# Altium schematic symbol library jlcpcb_2025_04_capacitors_extended_0603.schlib: 3668 symbols (part 20 of 20)
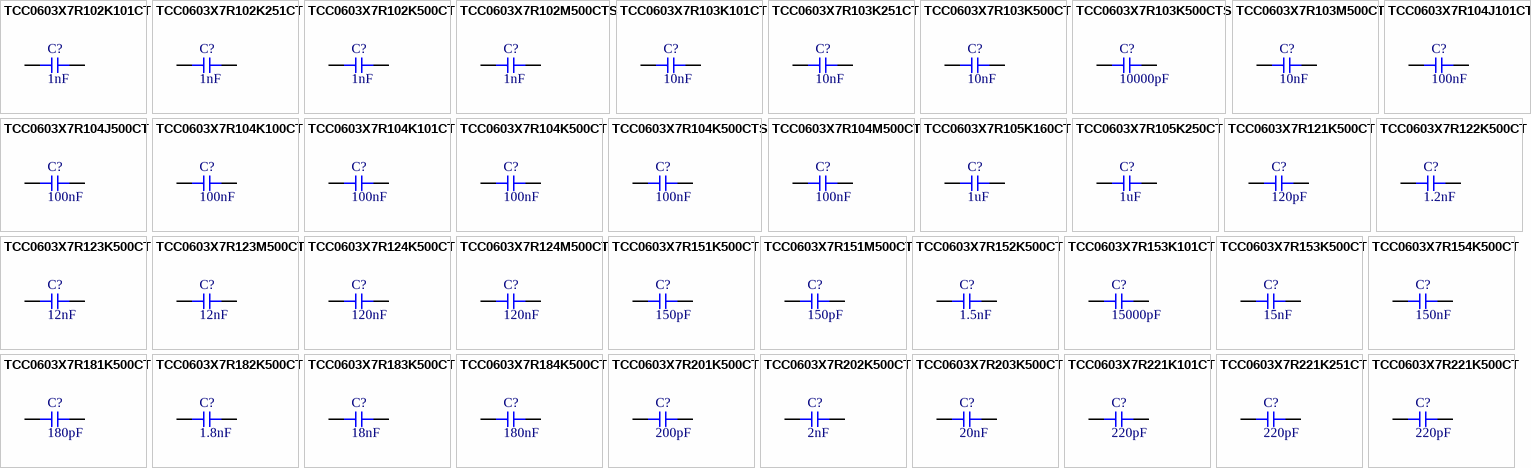
[diagram p110: symbols TCC0603X7R102K101CT to TCC0603X7R221K500CT]

## TCC0603X7R202K500CT
designator C?  Capacitance: 2nF  (hidden comment: *)
Capacitor, Ceramic (MLCC), 2nF, ±10%, 50V, X7R, ±10%, SMD 0603; Manufacturer: CCTC; Manufacturer Part Number: TCC0603X7R202K500CT; Package Size: 0603; JLCPCB Basic Part: No; JLCPCB Part Number: C376818; Supplier 1: LCSC; Category: Capacitors - MLCC; Supplier Part Number 1: C376818; Tolerance: ±10%; Voltage Rating: 50V; Temperature Coefficient: X7R; RoHS: Yes; ComponentLink1Description: Datasheet; ComponentLink1URL: https://wmsc.lcsc.com/wmsc/upload/file/pdf/v2/lcsc/2304140030_CCTC-TCC0603X7R202K500CT_C376818.pdf; ComponentLink2Description: JLCPCB Part URL; ComponentLink2URL: https://jlcpcb.com/partdetail/C376818; ComponentLink3Description: LCSC Part URL; ComponentLink3URL: https://lcsc.com/product-detail/Multilayer-Ceramic-Capacitors-MLCC---SMD-SMT_CCTC-CCTC-TCC0603X7R202K500CT_C376818.html
footprint CAP-0603 (0603 (1608M) Capacitor)
pins: 1, 2

## TCC0603X7R203K500CT
designator C?  Capacitance: 20nF  (hidden comment: *)
Capacitor, Ceramic (MLCC), 20nF, ±10%, 50V, X7R, ±10%, SMD 0603; Manufacturer: CCTC; Manufacturer Part Number: TCC0603X7R203K500CT; Package Size: 0603; JLCPCB Basic Part: No; JLCPCB Part Number: C376819; Supplier 1: LCSC; Category: Capacitors - MLCC; Supplier Part Number 1: C376819; Tolerance: ±10%; Voltage Rating: 50V; Temperature Coefficient: X7R; RoHS: Yes; ComponentLink1Description: Datasheet; ComponentLink1URL: https://wmsc.lcsc.com/wmsc/upload/file/pdf/v2/lcsc/2304140030_CCTC-TCC0603X7R203K500CT_C376819.pdf; ComponentLink2Description: JLCPCB Part URL; ComponentLink2URL: https://jlcpcb.com/partdetail/C376819; ComponentLink3Description: LCSC Part URL; ComponentLink3URL: https://lcsc.com/product-detail/Multilayer-Ceramic-Capacitors-MLCC---SMD-SMT_CCTC-CCTC-TCC0603X7R203K500CT_C376819.html
footprint CAP-0603 (0603 (1608M) Capacitor)
pins: 1, 2

## TCC0603X7R221K101CT
designator C?  Capacitance: 220pF  (hidden comment: *)
Capacitor, Ceramic (MLCC), 220pF, ±10%, 100V, X7R, ±10%, SMD 0603; Manufacturer: CCTC; Manufacturer Part Number: TCC0603X7R221K101CT; Package Size: 0603; JLCPCB Basic Part: No; JLCPCB Part Number: C376820; Supplier 1: LCSC; Category: Capacitors - MLCC; Supplier Part Number 1: C376820; Tolerance: ±10%; Voltage Rating: 100V; Temperature Coefficient: X7R; RoHS: Yes; ComponentLink1Description: Datasheet; ComponentLink1URL: https://wmsc.lcsc.com/wmsc/upload/file/pdf/v2/lcsc/2304140030_CCTC-TCC0603X7R221K101CT_C376820.pdf; ComponentLink2Description: JLCPCB Part URL; ComponentLink2URL: https://jlcpcb.com/partdetail/C376820; ComponentLink3Description: LCSC Part URL; ComponentLink3URL: https://lcsc.com/product-detail/Multilayer-Ceramic-Capacitors-MLCC---SMD-SMT_CCTC-CCTC-TCC0603X7R221K101CT_C376820.html
footprint CAP-0603 (0603 (1608M) Capacitor)
pins: 1, 2

## TCC0603X7R221K251CT
designator C?  Capacitance: 220pF  (hidden comment: *)
Capacitor, Ceramic (MLCC), 220pF, ±10%, 250V, X7R, ±10%, SMD 0603; Manufacturer: CCTC; Manufacturer Part Number: TCC0603X7R221K251CT; Package Size: 0603; JLCPCB Basic Part: No; JLCPCB Part Number: C696874; Supplier 1: LCSC; Category: Capacitors - MLCC; Supplier Part Number 1: C696874; Tolerance: ±10%; Voltage Rating: 250V; Temperature Coefficient: X7R; RoHS: Yes; ComponentLink1Description: Datasheet; ComponentLink1URL: https://wmsc.lcsc.com/wmsc/upload/file/pdf/v2/lcsc/2304140030_CCTC-TCC0603X7R221K251CT_C696874.pdf; ComponentLink2Description: JLCPCB Part URL; ComponentLink2URL: https://jlcpcb.com/partdetail/C696874; ComponentLink3Description: LCSC Part URL; ComponentLink3URL: https://lcsc.com/product-detail/Multilayer-Ceramic-Capacitors-MLCC---SMD-SMT_CCTC-CCTC-TCC0603X7R221K251CT_C696874.html
footprint CAP-0603 (0603 (1608M) Capacitor)
pins: 1, 2

## TCC0603X7R221K500CT
designator C?  Capacitance: 220pF  (hidden comment: *)
Capacitor, Ceramic (MLCC), 220pF, ±10%, 50V, X7R, ±10%, SMD 0603; Manufacturer: CCTC; Manufacturer Part Number: TCC0603X7R221K500CT; Package Size: 0603; JLCPCB Basic Part: No; JLCPCB Part Number: C282676; Supplier 1: LCSC; Category: Capacitors - MLCC; Supplier Part Number 1: C282676; Tolerance: ±10%; Voltage Rating: 50V; Temperature Coefficient: X7R; RoHS: Yes; ComponentLink1Description: Datasheet; ComponentLink1URL: https://wmsc.lcsc.com/wmsc/upload/file/pdf/v2/lcsc/2304140030_CCTC-TCC0603X7R221K500CT_C282676.pdf; ComponentLink2Description: JLCPCB Part URL; ComponentLink2URL: https://jlcpcb.com/partdetail/C282676; ComponentLink3Description: LCSC Part URL; ComponentLink3URL: https://lcsc.com/product-detail/Multilayer-Ceramic-Capacitors-MLCC---SMD-SMT_CCTC-CCTC-TCC0603X7R221K500CT_C282676.html
footprint CAP-0603 (0603 (1608M) Capacitor)
pins: 1, 2

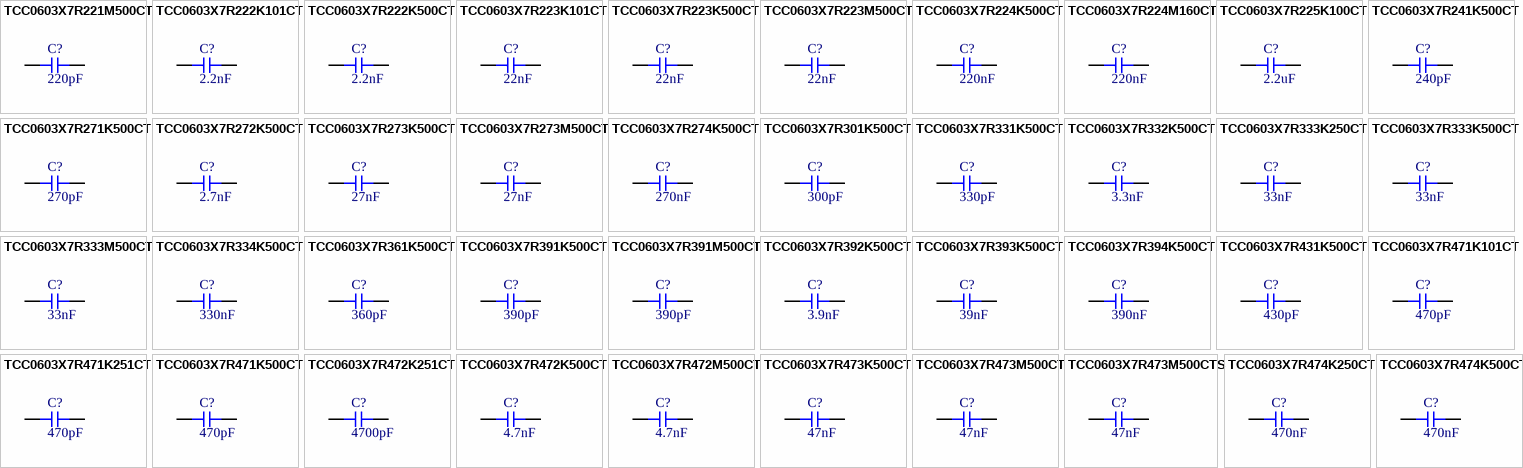
[diagram p88: symbols TCC0603X7R221M500CT to TCC0603X7R474K500CT]

## TCC0603X7R221M500CT
designator C?  Capacitance: 220pF  (hidden comment: *)
Capacitor, Ceramic (MLCC), 220pF, ±20%, 50V, X7R, ±20%, SMD 0603; Manufacturer: CCTC; Manufacturer Part Number: TCC0603X7R221M500CT; Package Size: 0603; JLCPCB Basic Part: No; JLCPCB Part Number: C2760542; Supplier 1: LCSC; Category: Capacitors - MLCC; Supplier Part Number 1: C2760542; Tolerance: ±20%; Voltage Rating: 50V; Temperature Coefficient: X7R; RoHS: Yes; ComponentLink1Description: Datasheet; ComponentLink1URL: https://wmsc.lcsc.com/wmsc/upload/file/pdf/v2/lcsc/2304140030_CCTC-TCC0603X7R221M500CT_C2760542.pdf; ComponentLink2Description: JLCPCB Part URL; ComponentLink2URL: https://jlcpcb.com/partdetail/C2760542; ComponentLink3Description: LCSC Part URL; ComponentLink3URL: https://lcsc.com/product-detail/Multilayer-Ceramic-Capacitors-MLCC---SMD-SMT_CCTC-CCTC-TCC0603X7R221M500CT_C2760542.html
footprint CAP-0603 (0603 (1608M) Capacitor)
pins: 1, 2

## TCC0603X7R222K101CT
designator C?  Capacitance: 2.2nF  (hidden comment: *)
Capacitor, Ceramic (MLCC), 2.2nF, ±10%, 100V, X7R, ±10%, SMD 0603; Manufacturer: CCTC; Manufacturer Part Number: TCC0603X7R222K101CT; Package Size: 0603; JLCPCB Basic Part: No; JLCPCB Part Number: C344172; Supplier 1: LCSC; Category: Capacitors - MLCC; Supplier Part Number 1: C344172; Tolerance: ±10%; Voltage Rating: 100V; Temperature Coefficient: X7R; RoHS: Yes; ComponentLink1Description: Datasheet; ComponentLink1URL: https://wmsc.lcsc.com/wmsc/upload/file/pdf/v2/lcsc/2304140030_CCTC-TCC0603X7R222K101CT_C344172.pdf; ComponentLink2Description: JLCPCB Part URL; ComponentLink2URL: https://jlcpcb.com/partdetail/C344172; ComponentLink3Description: LCSC Part URL; ComponentLink3URL: https://lcsc.com/product-detail/Multilayer-Ceramic-Capacitors-MLCC---SMD-SMT_CCTC-CCTC-TCC0603X7R222K101CT_C344172.html
footprint CAP-0603 (0603 (1608M) Capacitor)
pins: 1, 2

## TCC0603X7R222K500CT
designator C?  Capacitance: 2.2nF  (hidden comment: *)
Capacitor, Ceramic (MLCC), 2.2nF, ±10%, 50V, X7R, ±10%, SMD 0603; Manufacturer: CCTC; Manufacturer Part Number: TCC0603X7R222K500CT; Package Size: 0603; JLCPCB Basic Part: No; JLCPCB Part Number: C374074; Supplier 1: LCSC; Category: Capacitors - MLCC; Supplier Part Number 1: C374074; Tolerance: ±10%; Voltage Rating: 50V; Temperature Coefficient: X7R; RoHS: Yes; ComponentLink1Description: Datasheet; ComponentLink1URL: https://wmsc.lcsc.com/wmsc/upload/file/pdf/v2/lcsc/2304140030_CCTC-TCC0603X7R222K500CT_C374074.pdf; ComponentLink2Description: JLCPCB Part URL; ComponentLink2URL: https://jlcpcb.com/partdetail/C374074; ComponentLink3Description: LCSC Part URL; ComponentLink3URL: https://lcsc.com/product-detail/Multilayer-Ceramic-Capacitors-MLCC---SMD-SMT_CCTC-CCTC-TCC0603X7R222K500CT_C374074.html
footprint CAP-0603 (0603 (1608M) Capacitor)
pins: 1, 2

## TCC0603X7R223K101CT
designator C?  Capacitance: 22nF  (hidden comment: *)
Capacitor, Ceramic (MLCC), 22nF, ±10%, 100V, X7R, ±10%, SMD 0603; Manufacturer: CCTC; Manufacturer Part Number: TCC0603X7R223K101CT; Package Size: 0603; JLCPCB Basic Part: No; JLCPCB Part Number: C376821; Supplier 1: LCSC; Category: Capacitors - MLCC; Supplier Part Number 1: C376821; Tolerance: ±10%; Voltage Rating: 100V; Temperature Coefficient: X7R; RoHS: Yes; ComponentLink1Description: Datasheet; ComponentLink1URL: https://wmsc.lcsc.com/wmsc/upload/file/pdf/v2/lcsc/2304140030_CCTC-TCC0603X7R223K101CT_C376821.pdf; ComponentLink2Description: JLCPCB Part URL; ComponentLink2URL: https://jlcpcb.com/partdetail/C376821; ComponentLink3Description: LCSC Part URL; ComponentLink3URL: https://lcsc.com/product-detail/Multilayer-Ceramic-Capacitors-MLCC---SMD-SMT_CCTC-CCTC-TCC0603X7R223K101CT_C376821.html
footprint CAP-0603 (0603 (1608M) Capacitor)
pins: 1, 2

## TCC0603X7R223K500CT
designator C?  Capacitance: 22nF  (hidden comment: *)
Capacitor, Ceramic (MLCC), 22nF, ±10%, 50V, X7R, ±10%, SMD 0603; Manufacturer: CCTC; Manufacturer Part Number: TCC0603X7R223K500CT; Package Size: 0603; JLCPCB Basic Part: No; JLCPCB Part Number: C282677; Supplier 1: LCSC; Category: Capacitors - MLCC; Supplier Part Number 1: C282677; Tolerance: ±10%; Voltage Rating: 50V; Temperature Coefficient: X7R; RoHS: Yes; ComponentLink1Description: Datasheet; ComponentLink1URL: https://wmsc.lcsc.com/wmsc/upload/file/pdf/v2/lcsc/2304140030_CCTC-TCC0603X7R223K500CT_C282677.pdf; ComponentLink2Description: JLCPCB Part URL; ComponentLink2URL: https://jlcpcb.com/partdetail/C282677; ComponentLink3Description: LCSC Part URL; ComponentLink3URL: https://lcsc.com/product-detail/Multilayer-Ceramic-Capacitors-MLCC---SMD-SMT_CCTC-CCTC-TCC0603X7R223K500CT_C282677.html
footprint CAP-0603 (0603 (1608M) Capacitor)
pins: 1, 2

## TCC0603X7R223M500CT
designator C?  Capacitance: 22nF  (hidden comment: *)
Capacitor, Ceramic (MLCC), 22nF, ±20%, 50V, X7R, ±20%, SMD 0603; Manufacturer: CCTC; Manufacturer Part Number: TCC0603X7R223M500CT; Package Size: 0603; JLCPCB Basic Part: No; JLCPCB Part Number: C696861; Supplier 1: LCSC; Category: Capacitors - MLCC; Supplier Part Number 1: C696861; Tolerance: ±20%; Voltage Rating: 50V; Temperature Coefficient: X7R; RoHS: Yes; ComponentLink1Description: Datasheet; ComponentLink1URL: https://wmsc.lcsc.com/wmsc/upload/file/pdf/v2/lcsc/2304140030_CCTC-TCC0603X7R223M500CT_C696861.pdf; ComponentLink2Description: JLCPCB Part URL; ComponentLink2URL: https://jlcpcb.com/partdetail/C696861; ComponentLink3Description: LCSC Part URL; ComponentLink3URL: https://lcsc.com/product-detail/Multilayer-Ceramic-Capacitors-MLCC---SMD-SMT_CCTC-CCTC-TCC0603X7R223M500CT_C696861.html
footprint CAP-0603 (0603 (1608M) Capacitor)
pins: 1, 2

## TCC0603X7R224K500CT
designator C?  Capacitance: 220nF  (hidden comment: *)
Capacitor, Ceramic (MLCC), 220nF, ±10%, 50V, X7R, ±10%, SMD 0603; Manufacturer: CCTC; Manufacturer Part Number: TCC0603X7R224K500CT; Package Size: 0603; JLCPCB Basic Part: No; JLCPCB Part Number: C344195; Supplier 1: LCSC; Category: Capacitors - MLCC; Supplier Part Number 1: C344195; Tolerance: ±10%; Voltage Rating: 50V; Temperature Coefficient: X7R; RoHS: Yes; ComponentLink1Description: Datasheet; ComponentLink1URL: https://wmsc.lcsc.com/wmsc/upload/file/pdf/v2/lcsc/2304140030_CCTC-TCC0603X7R224K500CT_C344195.pdf; ComponentLink2Description: JLCPCB Part URL; ComponentLink2URL: https://jlcpcb.com/partdetail/C344195; ComponentLink3Description: LCSC Part URL; ComponentLink3URL: https://lcsc.com/product-detail/Multilayer-Ceramic-Capacitors-MLCC---SMD-SMT_CCTC-CCTC-TCC0603X7R224K500CT_C344195.html
footprint CAP-0603 (0603 (1608M) Capacitor)
pins: 1, 2

## TCC0603X7R224M160CT
designator C?  Capacitance: 220nF  (hidden comment: *)
Capacitor, Ceramic (MLCC), 220nF, ±20%, 16V, X7R, ±20%, SMD 0603; Manufacturer: CCTC; Manufacturer Part Number: TCC0603X7R224M160CT; Package Size: 0603; JLCPCB Basic Part: No; JLCPCB Part Number: C376822; Supplier 1: LCSC; Category: Capacitors - MLCC; Supplier Part Number 1: C376822; Tolerance: ±20%; Voltage Rating: 16V; Temperature Coefficient: X7R; RoHS: Yes; ComponentLink1Description: Datasheet; ComponentLink1URL: https://wmsc.lcsc.com/wmsc/upload/file/pdf/v2/lcsc/2304140030_CCTC-TCC0603X7R224M160CT_C376822.pdf; ComponentLink2Description: JLCPCB Part URL; ComponentLink2URL: https://jlcpcb.com/partdetail/C376822; ComponentLink3Description: LCSC Part URL; ComponentLink3URL: https://lcsc.com/product-detail/Multilayer-Ceramic-Capacitors-MLCC---SMD-SMT_CCTC-CCTC-TCC0603X7R224M160CT_C376822.html
footprint CAP-0603 (0603 (1608M) Capacitor)
pins: 1, 2

## TCC0603X7R225K100CT
designator C?  Capacitance: 2.2uF  (hidden comment: *)
Capacitor, Ceramic (MLCC), 2.2uF, ±10%, 10V, X7R, ±10%, SMD 0603; Manufacturer: CCTC; Manufacturer Part Number: TCC0603X7R225K100CT; Package Size: 0603; JLCPCB Basic Part: No; JLCPCB Part Number: C380329; Supplier 1: LCSC; Category: Capacitors - MLCC; Supplier Part Number 1: C380329; Tolerance: ±10%; Voltage Rating: 10V; Temperature Coefficient: X7R; RoHS: Yes; ComponentLink1Description: Datasheet; ComponentLink1URL: https://wmsc.lcsc.com/wmsc/upload/file/pdf/v2/lcsc/2304140030_CCTC-TCC0603X7R225K100CT_C380329.pdf; ComponentLink2Description: JLCPCB Part URL; ComponentLink2URL: https://jlcpcb.com/partdetail/C380329; ComponentLink3Description: LCSC Part URL; ComponentLink3URL: https://lcsc.com/product-detail/Multilayer-Ceramic-Capacitors-MLCC---SMD-SMT_CCTC-CCTC-TCC0603X7R225K100CT_C380329.html
footprint CAP-0603 (0603 (1608M) Capacitor)
pins: 1, 2

## TCC0603X7R241K500CT
designator C?  Capacitance: 240pF  (hidden comment: *)
Capacitor, Ceramic (MLCC), 240pF, ±10%, 50V, X7R, ±10%, SMD 0603; Manufacturer: CCTC; Manufacturer Part Number: TCC0603X7R241K500CT; Package Size: 0603; JLCPCB Basic Part: No; JLCPCB Part Number: C376823; Supplier 1: LCSC; Category: Capacitors - MLCC; Supplier Part Number 1: C376823; Tolerance: ±10%; Voltage Rating: 50V; Temperature Coefficient: X7R; RoHS: Yes; ComponentLink1Description: Datasheet; ComponentLink1URL: https://wmsc.lcsc.com/wmsc/upload/file/pdf/v2/lcsc/2304140030_CCTC-TCC0603X7R241K500CT_C376823.pdf; ComponentLink2Description: JLCPCB Part URL; ComponentLink2URL: https://jlcpcb.com/partdetail/C376823; ComponentLink3Description: LCSC Part URL; ComponentLink3URL: https://lcsc.com/product-detail/Multilayer-Ceramic-Capacitors-MLCC---SMD-SMT_CCTC-CCTC-TCC0603X7R241K500CT_C376823.html
footprint CAP-0603 (0603 (1608M) Capacitor)
pins: 1, 2

## TCC0603X7R271K500CT
designator C?  Capacitance: 270pF  (hidden comment: *)
Capacitor, Ceramic (MLCC), 270pF, ±10%, 50V, X7R, ±10%, SMD 0603; Manufacturer: CCTC; Manufacturer Part Number: TCC0603X7R271K500CT; Package Size: 0603; JLCPCB Basic Part: No; JLCPCB Part Number: C376824; Supplier 1: LCSC; Category: Capacitors - MLCC; Supplier Part Number 1: C376824; Tolerance: ±10%; Voltage Rating: 50V; Temperature Coefficient: X7R; RoHS: Yes; ComponentLink1Description: Datasheet; ComponentLink1URL: https://wmsc.lcsc.com/wmsc/upload/file/pdf/v2/lcsc/2304140030_CCTC-TCC0603X7R271K500CT_C376824.pdf; ComponentLink2Description: JLCPCB Part URL; ComponentLink2URL: https://jlcpcb.com/partdetail/C376824; ComponentLink3Description: LCSC Part URL; ComponentLink3URL: https://lcsc.com/product-detail/Multilayer-Ceramic-Capacitors-MLCC---SMD-SMT_CCTC-CCTC-TCC0603X7R271K500CT_C376824.html
footprint CAP-0603 (0603 (1608M) Capacitor)
pins: 1, 2

## TCC0603X7R272K500CT
designator C?  Capacitance: 2.7nF  (hidden comment: *)
Capacitor, Ceramic (MLCC), 2.7nF, ±10%, 50V, X7R, ±10%, SMD 0603; Manufacturer: CCTC; Manufacturer Part Number: TCC0603X7R272K500CT; Package Size: 0603; JLCPCB Basic Part: No; JLCPCB Part Number: C376825; Supplier 1: LCSC; Category: Capacitors - MLCC; Supplier Part Number 1: C376825; Tolerance: ±10%; Voltage Rating: 50V; Temperature Coefficient: X7R; RoHS: Yes; ComponentLink1Description: Datasheet; ComponentLink1URL: https://wmsc.lcsc.com/wmsc/upload/file/pdf/v2/lcsc/2304140030_CCTC-TCC0603X7R272K500CT_C376825.pdf; ComponentLink2Description: JLCPCB Part URL; ComponentLink2URL: https://jlcpcb.com/partdetail/C376825; ComponentLink3Description: LCSC Part URL; ComponentLink3URL: https://lcsc.com/product-detail/Multilayer-Ceramic-Capacitors-MLCC---SMD-SMT_CCTC-CCTC-TCC0603X7R272K500CT_C376825.html
footprint CAP-0603 (0603 (1608M) Capacitor)
pins: 1, 2

## TCC0603X7R273K500CT
designator C?  Capacitance: 27nF  (hidden comment: *)
Capacitor, Ceramic (MLCC), 27nF, ±10%, 50V, X7R, ±10%, SMD 0603; Manufacturer: CCTC; Manufacturer Part Number: TCC0603X7R273K500CT; Package Size: 0603; JLCPCB Basic Part: No; JLCPCB Part Number: C282678; Supplier 1: LCSC; Category: Capacitors - MLCC; Supplier Part Number 1: C282678; Tolerance: ±10%; Voltage Rating: 50V; Temperature Coefficient: X7R; RoHS: Yes; ComponentLink1Description: Datasheet; ComponentLink1URL: https://wmsc.lcsc.com/wmsc/upload/file/pdf/v2/lcsc/2304140030_CCTC-TCC0603X7R273K500CT_C282678.pdf; ComponentLink2Description: JLCPCB Part URL; ComponentLink2URL: https://jlcpcb.com/partdetail/C282678; ComponentLink3Description: LCSC Part URL; ComponentLink3URL: https://lcsc.com/product-detail/Multilayer-Ceramic-Capacitors-MLCC---SMD-SMT_CCTC-CCTC-TCC0603X7R273K500CT_C282678.html
footprint CAP-0603 (0603 (1608M) Capacitor)
pins: 1, 2

## TCC0603X7R273M500CT
designator C?  Capacitance: 27nF  (hidden comment: *)
Capacitor, Ceramic (MLCC), 27nF, ±10%, 50V, X7R, ±10%, SMD 0603; Manufacturer: CCTC; Manufacturer Part Number: TCC0603X7R273M500CT; Package Size: 0603; JLCPCB Basic Part: No; JLCPCB Part Number: C778607; Supplier 1: LCSC; Category: Capacitors - MLCC; Supplier Part Number 1: C778607; Tolerance: ±10%; Voltage Rating: 50V; Temperature Coefficient: X7R; RoHS: Yes; ComponentLink1Description: Datasheet; ComponentLink1URL: https://wmsc.lcsc.com/wmsc/upload/file/pdf/v2/lcsc/2304140030_CCTC-TCC0603X7R273M500CT_C778607.pdf; ComponentLink2Description: JLCPCB Part URL; ComponentLink2URL: https://jlcpcb.com/partdetail/C778607; ComponentLink3Description: LCSC Part URL; ComponentLink3URL: https://lcsc.com/product-detail/Multilayer-Ceramic-Capacitors-MLCC---SMD-SMT_CCTC-CCTC-TCC0603X7R273M500CT_C778607.html
footprint CAP-0603 (0603 (1608M) Capacitor)
pins: 1, 2

## TCC0603X7R274K500CT
designator C?  Capacitance: 270nF  (hidden comment: *)
Capacitor, Ceramic (MLCC), 270nF, ±10%, 50V, X7R, ±10%, SMD 0603; Manufacturer: CCTC; Manufacturer Part Number: TCC0603X7R274K500CT; Package Size: 0603; JLCPCB Basic Part: No; JLCPCB Part Number: C376826; Supplier 1: LCSC; Category: Capacitors - MLCC; Supplier Part Number 1: C376826; Tolerance: ±10%; Voltage Rating: 50V; Temperature Coefficient: X7R; RoHS: Yes; ComponentLink1Description: Datasheet; ComponentLink1URL: https://wmsc.lcsc.com/wmsc/upload/file/pdf/v2/lcsc/2304140030_CCTC-TCC0603X7R274K500CT_C376826.pdf; ComponentLink2Description: JLCPCB Part URL; ComponentLink2URL: https://jlcpcb.com/partdetail/C376826; ComponentLink3Description: LCSC Part URL; ComponentLink3URL: https://lcsc.com/product-detail/Multilayer-Ceramic-Capacitors-MLCC---SMD-SMT_CCTC-CCTC-TCC0603X7R274K500CT_C376826.html
footprint CAP-0603 (0603 (1608M) Capacitor)
pins: 1, 2

## TCC0603X7R301K500CT
designator C?  Capacitance: 300pF  (hidden comment: *)
Capacitor, Ceramic (MLCC), 300pF, ±10%, 50V, X7R, ±10%, SMD 0603; Manufacturer: CCTC; Manufacturer Part Number: TCC0603X7R301K500CT; Package Size: 0603; JLCPCB Basic Part: No; JLCPCB Part Number: C376827; Supplier 1: LCSC; Category: Capacitors - MLCC; Supplier Part Number 1: C376827; Tolerance: ±10%; Voltage Rating: 50V; Temperature Coefficient: X7R; RoHS: Yes; ComponentLink1Description: Datasheet; ComponentLink1URL: https://wmsc.lcsc.com/wmsc/upload/file/pdf/v2/lcsc/2304140030_CCTC-TCC0603X7R301K500CT_C376827.pdf; ComponentLink2Description: JLCPCB Part URL; ComponentLink2URL: https://jlcpcb.com/partdetail/C376827; ComponentLink3Description: LCSC Part URL; ComponentLink3URL: https://lcsc.com/product-detail/Multilayer-Ceramic-Capacitors-MLCC---SMD-SMT_CCTC-CCTC-TCC0603X7R301K500CT_C376827.html
footprint CAP-0603 (0603 (1608M) Capacitor)
pins: 1, 2

## TCC0603X7R331K500CT
designator C?  Capacitance: 330pF  (hidden comment: *)
Capacitor, Ceramic (MLCC), 330pF, ±10%, 50V, X7R, ±10%, SMD 0603; Manufacturer: CCTC; Manufacturer Part Number: TCC0603X7R331K500CT; Package Size: 0603; JLCPCB Basic Part: No; JLCPCB Part Number: C282679; Supplier 1: LCSC; Category: Capacitors - MLCC; Supplier Part Number 1: C282679; Tolerance: ±10%; Voltage Rating: 50V; Temperature Coefficient: X7R; RoHS: Yes; ComponentLink1Description: Datasheet; ComponentLink1URL: https://wmsc.lcsc.com/wmsc/upload/file/pdf/v2/lcsc/2304140030_CCTC-TCC0603X7R331K500CT_C282679.pdf; ComponentLink2Description: JLCPCB Part URL; ComponentLink2URL: https://jlcpcb.com/partdetail/C282679; ComponentLink3Description: LCSC Part URL; ComponentLink3URL: https://lcsc.com/product-detail/Multilayer-Ceramic-Capacitors-MLCC---SMD-SMT_CCTC-CCTC-TCC0603X7R331K500CT_C282679.html
footprint CAP-0603 (0603 (1608M) Capacitor)
pins: 1, 2

## TCC0603X7R332K500CT
designator C?  Capacitance: 3.3nF  (hidden comment: *)
Capacitor, Ceramic (MLCC), 3.3nF, ±10%, 50V, X7R, ±10%, SMD 0603; Manufacturer: CCTC; Manufacturer Part Number: TCC0603X7R332K500CT; Package Size: 0603; JLCPCB Basic Part: No; JLCPCB Part Number: C282680; Supplier 1: LCSC; Category: Capacitors - MLCC; Supplier Part Number 1: C282680; Tolerance: ±10%; Voltage Rating: 50V; Temperature Coefficient: X7R; RoHS: Yes; ComponentLink1Description: Datasheet; ComponentLink1URL: https://wmsc.lcsc.com/wmsc/upload/file/pdf/v2/lcsc/2304140030_CCTC-TCC0603X7R332K500CT_C282680.pdf; ComponentLink2Description: JLCPCB Part URL; ComponentLink2URL: https://jlcpcb.com/partdetail/C282680; ComponentLink3Description: LCSC Part URL; ComponentLink3URL: https://lcsc.com/product-detail/Multilayer-Ceramic-Capacitors-MLCC---SMD-SMT_CCTC-CCTC-TCC0603X7R332K500CT_C282680.html
footprint CAP-0603 (0603 (1608M) Capacitor)
pins: 1, 2

## TCC0603X7R333K250CT
designator C?  Capacitance: 33nF  (hidden comment: *)
Capacitor, Ceramic (MLCC), 33nF, ±10%, 25V, X7R, ±10%, SMD 0603; Manufacturer: CCTC; Manufacturer Part Number: TCC0603X7R333K250CT; Package Size: 0603; JLCPCB Basic Part: No; JLCPCB Part Number: C376828; Supplier 1: LCSC; Category: Capacitors - MLCC; Supplier Part Number 1: C376828; Tolerance: ±10%; Voltage Rating: 25V; Temperature Coefficient: X7R; RoHS: Yes; ComponentLink1Description: Datasheet; ComponentLink1URL: https://wmsc.lcsc.com/wmsc/upload/file/pdf/v2/lcsc/2304140030_CCTC-TCC0603X7R333K250CT_C376828.pdf; ComponentLink2Description: JLCPCB Part URL; ComponentLink2URL: https://jlcpcb.com/partdetail/C376828; ComponentLink3Description: LCSC Part URL; ComponentLink3URL: https://lcsc.com/product-detail/Multilayer-Ceramic-Capacitors-MLCC---SMD-SMT_CCTC-CCTC-TCC0603X7R333K250CT_C376828.html
footprint CAP-0603 (0603 (1608M) Capacitor)
pins: 1, 2

## TCC0603X7R333K500CT
designator C?  Capacitance: 33nF  (hidden comment: *)
Capacitor, Ceramic (MLCC), 33nF, ±10%, 50V, X7R, ±10%, SMD 0603; Manufacturer: CCTC; Manufacturer Part Number: TCC0603X7R333K500CT; Package Size: 0603; JLCPCB Basic Part: No; JLCPCB Part Number: C282681; Supplier 1: LCSC; Category: Capacitors - MLCC; Supplier Part Number 1: C282681; Tolerance: ±10%; Voltage Rating: 50V; Temperature Coefficient: X7R; RoHS: Yes; ComponentLink1Description: Datasheet; ComponentLink1URL: https://wmsc.lcsc.com/wmsc/upload/file/pdf/v2/lcsc/2304140030_CCTC-TCC0603X7R333K500CT_C282681.pdf; ComponentLink2Description: JLCPCB Part URL; ComponentLink2URL: https://jlcpcb.com/partdetail/C282681; ComponentLink3Description: LCSC Part URL; ComponentLink3URL: https://lcsc.com/product-detail/Multilayer-Ceramic-Capacitors-MLCC---SMD-SMT_CCTC-CCTC-TCC0603X7R333K500CT_C282681.html
footprint CAP-0603 (0603 (1608M) Capacitor)
pins: 1, 2

## TCC0603X7R333M500CT
designator C?  Capacitance: 33nF  (hidden comment: *)
Capacitor, Ceramic (MLCC), 33nF, ±20%, 50V, X7R, ±20%, SMD 0603; Manufacturer: CCTC; Manufacturer Part Number: TCC0603X7R333M500CT; Package Size: 0603; JLCPCB Basic Part: No; JLCPCB Part Number: C696862; Supplier 1: LCSC; Category: Capacitors - MLCC; Supplier Part Number 1: C696862; Tolerance: ±20%; Voltage Rating: 50V; Temperature Coefficient: X7R; RoHS: Yes; ComponentLink1Description: Datasheet; ComponentLink1URL: https://wmsc.lcsc.com/wmsc/upload/file/pdf/v2/lcsc/2304140030_CCTC-TCC0603X7R333M500CT_C696862.pdf; ComponentLink2Description: JLCPCB Part URL; ComponentLink2URL: https://jlcpcb.com/partdetail/C696862; ComponentLink3Description: LCSC Part URL; ComponentLink3URL: https://lcsc.com/product-detail/Multilayer-Ceramic-Capacitors-MLCC---SMD-SMT_CCTC-CCTC-TCC0603X7R333M500CT_C696862.html
footprint CAP-0603 (0603 (1608M) Capacitor)
pins: 1, 2

## TCC0603X7R334K500CT
designator C?  Capacitance: 330nF  (hidden comment: *)
Capacitor, Ceramic (MLCC), 330nF, ±10%, 50V, X7R, ±10%, SMD 0603; Manufacturer: CCTC; Manufacturer Part Number: TCC0603X7R334K500CT; Package Size: 0603; JLCPCB Basic Part: No; JLCPCB Part Number: C282682; Supplier 1: LCSC; Category: Capacitors - MLCC; Supplier Part Number 1: C282682; Tolerance: ±10%; Voltage Rating: 50V; Temperature Coefficient: X7R; RoHS: Yes; ComponentLink1Description: Datasheet; ComponentLink1URL: https://wmsc.lcsc.com/wmsc/upload/file/pdf/v2/lcsc/2304140030_CCTC-TCC0603X7R334K500CT_C282682.pdf; ComponentLink2Description: JLCPCB Part URL; ComponentLink2URL: https://jlcpcb.com/partdetail/C282682; ComponentLink3Description: LCSC Part URL; ComponentLink3URL: https://lcsc.com/product-detail/Multilayer-Ceramic-Capacitors-MLCC---SMD-SMT_CCTC-CCTC-TCC0603X7R334K500CT_C282682.html
footprint CAP-0603 (0603 (1608M) Capacitor)
pins: 1, 2

## TCC0603X7R361K500CT
designator C?  Capacitance: 360pF  (hidden comment: *)
Capacitor, Ceramic (MLCC), 360pF, ±10%, 50V, X7R, ±10%, SMD 0603; Manufacturer: CCTC; Manufacturer Part Number: TCC0603X7R361K500CT; Package Size: 0603; JLCPCB Basic Part: No; JLCPCB Part Number: C376829; Supplier 1: LCSC; Category: Capacitors - MLCC; Supplier Part Number 1: C376829; Tolerance: ±10%; Voltage Rating: 50V; Temperature Coefficient: X7R; RoHS: Yes; ComponentLink1Description: Datasheet; ComponentLink1URL: https://wmsc.lcsc.com/wmsc/upload/file/pdf/v2/lcsc/2304140030_CCTC-TCC0603X7R361K500CT_C376829.pdf; ComponentLink2Description: JLCPCB Part URL; ComponentLink2URL: https://jlcpcb.com/partdetail/C376829; ComponentLink3Description: LCSC Part URL; ComponentLink3URL: https://lcsc.com/product-detail/Multilayer-Ceramic-Capacitors-MLCC---SMD-SMT_CCTC-CCTC-TCC0603X7R361K500CT_C376829.html
footprint CAP-0603 (0603 (1608M) Capacitor)
pins: 1, 2

## TCC0603X7R391K500CT
designator C?  Capacitance: 390pF  (hidden comment: *)
Capacitor, Ceramic (MLCC), 390pF, ±10%, 50V, X7R, ±10%, SMD 0603; Manufacturer: CCTC; Manufacturer Part Number: TCC0603X7R391K500CT; Package Size: 0603; JLCPCB Basic Part: No; JLCPCB Part Number: C376830; Supplier 1: LCSC; Category: Capacitors - MLCC; Supplier Part Number 1: C376830; Tolerance: ±10%; Voltage Rating: 50V; Temperature Coefficient: X7R; RoHS: Yes; ComponentLink1Description: Datasheet; ComponentLink1URL: https://wmsc.lcsc.com/wmsc/upload/file/pdf/v2/lcsc/2304140030_CCTC-TCC0603X7R391K500CT_C376830.pdf; ComponentLink2Description: JLCPCB Part URL; ComponentLink2URL: https://jlcpcb.com/partdetail/C376830; ComponentLink3Description: LCSC Part URL; ComponentLink3URL: https://lcsc.com/product-detail/Multilayer-Ceramic-Capacitors-MLCC---SMD-SMT_CCTC-CCTC-TCC0603X7R391K500CT_C376830.html
footprint CAP-0603 (0603 (1608M) Capacitor)
pins: 1, 2

## TCC0603X7R391M500CT
designator C?  Capacitance: 390pF  (hidden comment: *)
Capacitor, Ceramic (MLCC), 390pF, ±20%, 50V, X7R, ±20%, SMD 0603; Manufacturer: CCTC; Manufacturer Part Number: TCC0603X7R391M500CT; Package Size: 0603; JLCPCB Basic Part: No; JLCPCB Part Number: C376831; Supplier 1: LCSC; Category: Capacitors - MLCC; Supplier Part Number 1: C376831; Tolerance: ±20%; Voltage Rating: 50V; Temperature Coefficient: X7R; RoHS: Yes; ComponentLink1Description: Datasheet; ComponentLink1URL: https://wmsc.lcsc.com/wmsc/upload/file/pdf/v2/lcsc/2304140030_CCTC-TCC0603X7R391M500CT_C376831.pdf; ComponentLink2Description: JLCPCB Part URL; ComponentLink2URL: https://jlcpcb.com/partdetail/C376831; ComponentLink3Description: LCSC Part URL; ComponentLink3URL: https://lcsc.com/product-detail/Multilayer-Ceramic-Capacitors-MLCC---SMD-SMT_CCTC-CCTC-TCC0603X7R391M500CT_C376831.html
footprint CAP-0603 (0603 (1608M) Capacitor)
pins: 1, 2

## TCC0603X7R392K500CT
designator C?  Capacitance: 3.9nF  (hidden comment: *)
Capacitor, Ceramic (MLCC), 3.9nF, ±10%, 50V, X7R, ±10%, SMD 0603; Manufacturer: CCTC; Manufacturer Part Number: TCC0603X7R392K500CT; Package Size: 0603; JLCPCB Basic Part: No; JLCPCB Part Number: C376832; Supplier 1: LCSC; Category: Capacitors - MLCC; Supplier Part Number 1: C376832; Tolerance: ±10%; Voltage Rating: 50V; Temperature Coefficient: X7R; RoHS: Yes; ComponentLink1Description: Datasheet; ComponentLink1URL: https://wmsc.lcsc.com/wmsc/upload/file/pdf/v2/lcsc/2304140030_CCTC-TCC0603X7R392K500CT_C376832.pdf; ComponentLink2Description: JLCPCB Part URL; ComponentLink2URL: https://jlcpcb.com/partdetail/C376832; ComponentLink3Description: LCSC Part URL; ComponentLink3URL: https://lcsc.com/product-detail/Multilayer-Ceramic-Capacitors-MLCC---SMD-SMT_CCTC-CCTC-TCC0603X7R392K500CT_C376832.html
footprint CAP-0603 (0603 (1608M) Capacitor)
pins: 1, 2

## TCC0603X7R393K500CT
designator C?  Capacitance: 39nF  (hidden comment: *)
Capacitor, Ceramic (MLCC), 39nF, ±10%, 50V, X7R, ±10%, SMD 0603; Manufacturer: CCTC; Manufacturer Part Number: TCC0603X7R393K500CT; Package Size: 0603; JLCPCB Basic Part: No; JLCPCB Part Number: C282683; Supplier 1: LCSC; Category: Capacitors - MLCC; Supplier Part Number 1: C282683; Tolerance: ±10%; Voltage Rating: 50V; Temperature Coefficient: X7R; RoHS: Yes; ComponentLink1Description: Datasheet; ComponentLink1URL: https://wmsc.lcsc.com/wmsc/upload/file/pdf/v2/lcsc/2304140030_CCTC-TCC0603X7R393K500CT_C282683.pdf; ComponentLink2Description: JLCPCB Part URL; ComponentLink2URL: https://jlcpcb.com/partdetail/C282683; ComponentLink3Description: LCSC Part URL; ComponentLink3URL: https://lcsc.com/product-detail/Multilayer-Ceramic-Capacitors-MLCC---SMD-SMT_CCTC-CCTC-TCC0603X7R393K500CT_C282683.html
footprint CAP-0603 (0603 (1608M) Capacitor)
pins: 1, 2

## TCC0603X7R394K500CT
designator C?  Capacitance: 390nF  (hidden comment: *)
Capacitor, Ceramic (MLCC), 390nF, ±10%, 50V, X7R, ±10%, SMD 0603; Manufacturer: CCTC; Manufacturer Part Number: TCC0603X7R394K500CT; Package Size: 0603; JLCPCB Basic Part: No; JLCPCB Part Number: C376833; Supplier 1: LCSC; Category: Capacitors - MLCC; Supplier Part Number 1: C376833; Tolerance: ±10%; Voltage Rating: 50V; Temperature Coefficient: X7R; RoHS: Yes; ComponentLink1Description: Datasheet; ComponentLink1URL: https://wmsc.lcsc.com/wmsc/upload/file/pdf/v2/lcsc/2304140030_CCTC-TCC0603X7R394K500CT_C376833.pdf; ComponentLink2Description: JLCPCB Part URL; ComponentLink2URL: https://jlcpcb.com/partdetail/C376833; ComponentLink3Description: LCSC Part URL; ComponentLink3URL: https://lcsc.com/product-detail/Multilayer-Ceramic-Capacitors-MLCC---SMD-SMT_CCTC-CCTC-TCC0603X7R394K500CT_C376833.html
footprint CAP-0603 (0603 (1608M) Capacitor)
pins: 1, 2

## TCC0603X7R431K500CT
designator C?  Capacitance: 430pF  (hidden comment: *)
Capacitor, Ceramic (MLCC), 430pF, ±10%, 50V, X7R, ±10%, SMD 0603; Manufacturer: CCTC; Manufacturer Part Number: TCC0603X7R431K500CT; Package Size: 0603; JLCPCB Basic Part: No; JLCPCB Part Number: C7393906; Supplier 1: LCSC; Category: Capacitors - MLCC; Supplier Part Number 1: C7393906; Tolerance: ±10%; Voltage Rating: 50V; Temperature Coefficient: X7R; RoHS: Yes; ComponentLink1Description: Datasheet; ComponentLink1URL: https://wmsc.lcsc.com/wmsc/upload/file/pdf/v2/lcsc/2306211554_CCTC-TCC0603X7R431K500CT_C7393906.pdf; ComponentLink2Description: JLCPCB Part URL; ComponentLink2URL: https://jlcpcb.com/partdetail/C7393906; ComponentLink3Description: LCSC Part URL; ComponentLink3URL: https://lcsc.com/product-detail/Multilayer-Ceramic-Capacitors-MLCC---SMD-SMT_CCTC-CCTC-TCC0603X7R431K500CT_C7393906.html
footprint CAP-0603 (0603 (1608M) Capacitor)
pins: 1, 2

## TCC0603X7R471K101CT
designator C?  Capacitance: 470pF  (hidden comment: *)
Capacitor, Ceramic (MLCC), 470pF, ±10%, 100V, X7R, ±10%, SMD 0603; Manufacturer: CCTC; Manufacturer Part Number: TCC0603X7R471K101CT; Package Size: 0603; JLCPCB Basic Part: No; JLCPCB Part Number: C376834; Supplier 1: LCSC; Category: Capacitors - MLCC; Supplier Part Number 1: C376834; Tolerance: ±10%; Voltage Rating: 100V; Temperature Coefficient: X7R; RoHS: Yes; ComponentLink1Description: Datasheet; ComponentLink1URL: https://wmsc.lcsc.com/wmsc/upload/file/pdf/v2/lcsc/2304140030_CCTC-TCC0603X7R471K101CT_C376834.pdf; ComponentLink2Description: JLCPCB Part URL; ComponentLink2URL: https://jlcpcb.com/partdetail/C376834; ComponentLink3Description: LCSC Part URL; ComponentLink3URL: https://lcsc.com/product-detail/Multilayer-Ceramic-Capacitors-MLCC---SMD-SMT_CCTC-CCTC-TCC0603X7R471K101CT_C376834.html
footprint CAP-0603 (0603 (1608M) Capacitor)
pins: 1, 2

## TCC0603X7R471K251CT
designator C?  Capacitance: 470pF  (hidden comment: *)
Capacitor, Ceramic (MLCC), 470pF, ±10%, 250V, X7R, ±10%, SMD 0603; Manufacturer: CCTC; Manufacturer Part Number: TCC0603X7R471K251CT; Package Size: 0603; JLCPCB Basic Part: No; JLCPCB Part Number: C376835; Supplier 1: LCSC; Category: Capacitors - MLCC; Supplier Part Number 1: C376835; Tolerance: ±10%; Voltage Rating: 250V; Temperature Coefficient: X7R; RoHS: Yes; ComponentLink1Description: Datasheet; ComponentLink1URL: https://wmsc.lcsc.com/wmsc/upload/file/pdf/v2/lcsc/2304140030_CCTC-TCC0603X7R471K251CT_C376835.pdf; ComponentLink2Description: JLCPCB Part URL; ComponentLink2URL: https://jlcpcb.com/partdetail/C376835; ComponentLink3Description: LCSC Part URL; ComponentLink3URL: https://lcsc.com/product-detail/Multilayer-Ceramic-Capacitors-MLCC---SMD-SMT_CCTC-CCTC-TCC0603X7R471K251CT_C376835.html
footprint CAP-0603 (0603 (1608M) Capacitor)
pins: 1, 2

## TCC0603X7R471K500CT
designator C?  Capacitance: 470pF  (hidden comment: *)
Capacitor, Ceramic (MLCC), 470pF, ±10%, 50V, X7R, ±10%, SMD 0603; Manufacturer: CCTC; Manufacturer Part Number: TCC0603X7R471K500CT; Package Size: 0603; JLCPCB Basic Part: No; JLCPCB Part Number: C376836; Supplier 1: LCSC; Category: Capacitors - MLCC; Supplier Part Number 1: C376836; Tolerance: ±10%; Voltage Rating: 50V; Temperature Coefficient: X7R; RoHS: Yes; ComponentLink1Description: Datasheet; ComponentLink1URL: https://wmsc.lcsc.com/wmsc/upload/file/pdf/v2/lcsc/2304140030_CCTC-TCC0603X7R471K500CT_C376836.pdf; ComponentLink2Description: JLCPCB Part URL; ComponentLink2URL: https://jlcpcb.com/partdetail/C376836; ComponentLink3Description: LCSC Part URL; ComponentLink3URL: https://lcsc.com/product-detail/Multilayer-Ceramic-Capacitors-MLCC---SMD-SMT_CCTC-CCTC-TCC0603X7R471K500CT_C376836.html
footprint CAP-0603 (0603 (1608M) Capacitor)
pins: 1, 2
